# Altium integrated library Cap-El-THP_V2.IntLib: 241 symbols (part 1 of 2)
Pins are listed as number, name and electrical type; pins without a type are passive.

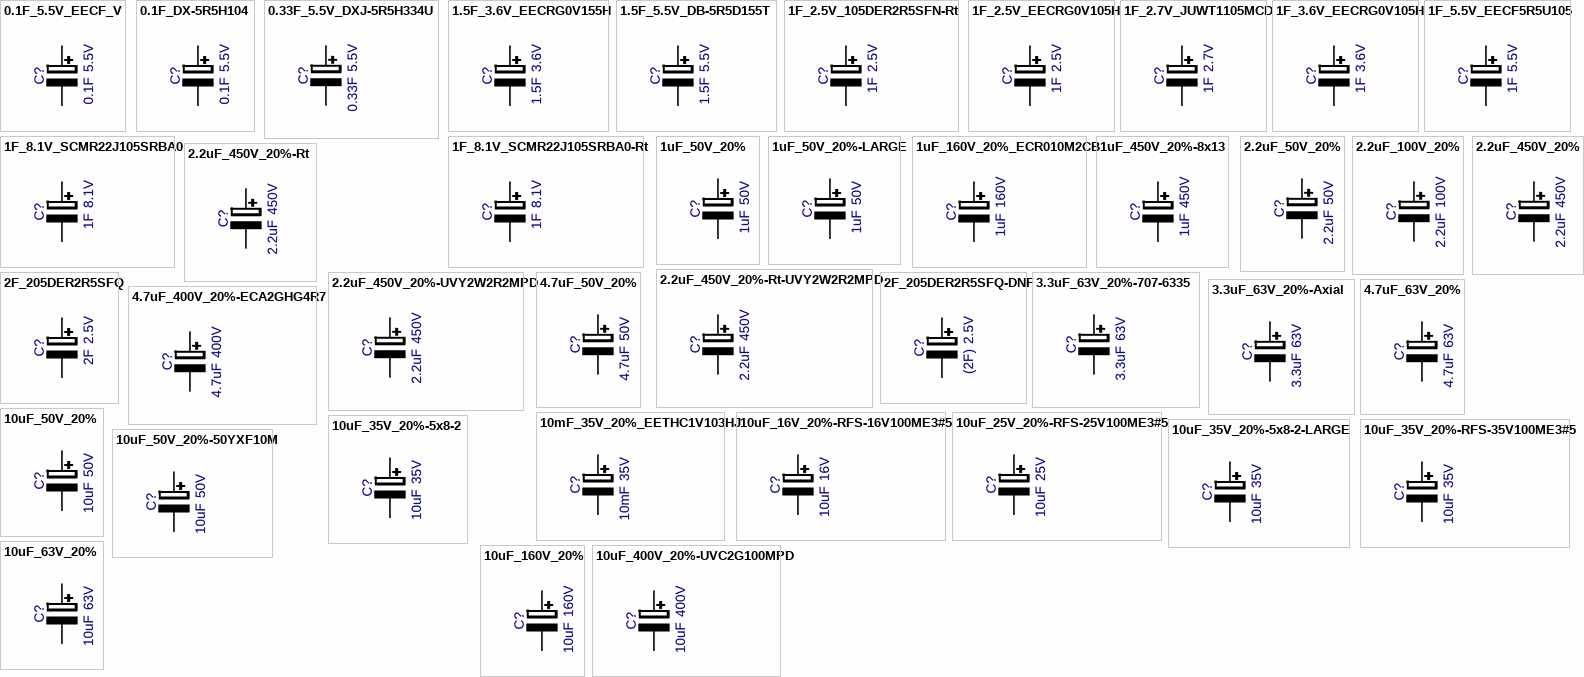
[diagram p0: symbols 0.1F_5.5V_EECF_V to 10uF_400V_20%-UVC2G100MPD]

## 0.1F_5.5V_EECF_V
designator C?, comment value 0.1F  Voltage: 5.5V  (hidden comment: CAP-EL_0.1F_5.5V_EECF)
Cap Double Layer (Super Cap); Manufacturer: Panasonic; Part Number: EECF5R5U104; Tol: 20%; Package: CAP-EECF-H; EDM-PN: *; Text2: *; Text1: *
footprint CAP-EECF-H (CAP-EECF-H 13.5x7.5mm)
pins: 1, 2

## 0.1F_DX-5R5H104
designator C?, comment value 0.1F  Voltage: 5.5V  (hidden comment: DX-5R5H104)
Cap Double Layer (Super Cap); Manufacturer: Elna; Tol: 20%; Part Number: DX-5R5H104; Package: CAP-DX-H; EDM-PN: *; Text2: *; Text1: *
footprint CAP-DX-H (CAP-DX-H 12.4x11.5mm)
pins: 1, 2

## 0.33F_5.5V_DXJ-5R5H334U
designator C?, comment value 0.33F  Voltage: 5.5V  (hidden comment: DXJ-5R5H334U)
Cap Double Layer (Super Cap); Manufacturer: Elna; Tol: 20%; Part Number: DXJ-5R5H334U; Package: CAP-DX-H; EDM-PN: *; Text2: *; Text1: *
footprint CAP-DX-H (CAP-DX-H 12.4x11.5mm)
pins: 1, 2

## 1.5F_3.6V_EECRG0V155H
designator C?, comment value 1.5F  Voltage: 3.6V  (hidden comment: EECRG0V155H)
Cap Double Layer (Gold Cap); Manufacturer: Panasonic; Tol: 1.2-2.7F; Part Number: EECRG0V155H; Package: CAP-EECRG-H-19.0mm; EDM-PN: *; Text2: *; Text1: *
footprint CAP-EECRG-H-19.0mm (CAP-EECRG-H 19.0x19.0mm)
pins: 1, 2

## 1.5F_5.5V_DB-5R5D155T
designator C?, comment value 1.5F  Voltage: 5.5V  (hidden comment: DB-5R5D155T)
Cap Double Layer Supercapacitor; Manufacturer: Elna; Tol: 20%; Part Number: DB-5R5D155T; Package: CAP-EECF-H-21.5MM; EDM-PN: *; Text2: *; Text1: *
footprint CAP-21.5mm-8MM (CAP 21.5x21.5mm)
pins: 1, 2

## 1F_2.5V_105DER2R5SFN-Rt
designator C?, comment value 1F  Voltage: 2.5V  (hidden comment: CAP-EL_1F_2.5V_105DER2R5SFN)
Cap (EDLC) Supercap; Manufacturer: Illinois Capacitor; Part Number: EECRG0V105H; Tol: +50-20%; Package: EL-RAD-8X13.5-Black-RT; EDM-PN: *; Text2: *; Text1: *
footprint EL-RAD-8X13.5-Black-RT (Capacitor, Electrolytic, THP, Radial, Dia 8.00mm, Pitch 3.50mm)
pins: 1, 2

## 1F_2.5V_EECRG0V105H
designator C?, comment value 1F  Voltage: 2.5V  (hidden comment: EECRG0V105H)
Cap (EDLC) Supercap; Manufacturer: Illinois Capacitor; Tol: +50-20%; Part Number: EECRG0V105H; Package: EL-RAD-8X13.5-Black; EDM-PN: *; Text2: *; Text1: *
footprint EL-RAD-8X13.5-Black (Capacitor, Electrolytic, THP, Radial, Dia 8.00mm, Pitch 3.50mm)
pins: 1, 2

## 1F_2.7V_JUWT1105MCD
designator C?, comment value 1F  Voltage: 2.7V  (hidden comment: JUWT1105MCD)
Cap (EDLC) Supercap; Manufacturer: Nichicon; Tol: 20%; Part Number: JUWT1105MCD; Package: EL-RAD-6.3x11; EDM-PN: *; Text2: *; Text1: *
footprint EL-RAD-6.3X11 (Capacitor, Electrolytic, THP, Radial, Dia 6.3mm, Pitch 2.5mm)
pins: 1, 2

## 1F_3.6V_EECRG0V105H
designator C?, comment value 1F  Voltage: 3.6V  (hidden comment: EECRG0V105H)
Cap Double Layer (Gold Cap); Manufacturer: Panasonic; Tol: 0.8-1.8F; Part Number: EECRG0V105H; Package: CAP-EECRG-H-19.0mm; EDM-PN: *; Text2: *; Text1: *
footprint CAP-EECRG-H-19.0mm (CAP-EECRG-H 19.0x19.0mm)
pins: 1, 2

## 1F_5.5V_EECF5R5U105
designator C?, comment value 1F  Voltage: 5.5V  (hidden comment: EECF5R5U105)
Cap Double Layer (Gold Cap); Manufacturer: Panasonic; Tol: 20%; Part Number: EECF5R5U105; Package: CAP-EECF-H-21.5MM; EDM-PN: *; Text2: *; Text1: *
footprint CAP-EECF-H-21.5mm (CAP-EECF-H 21.5x21.5mm)
pins: 1, 2

## 1F_8.1V_SCMR22J105SRBA0
designator C?, comment value 1F  Voltage: 8.1V  (hidden comment: SCMR22J105SRBA0)
Cap Supercapacitor Radial; Manufacturer: AVX; Tol: -10+30%; Part Number: SCMR22J105SRBA0; Package: SMC-8x24mm 22mm; EDM-PN: *; Text2: *; Text1: *
footprint SMC-8x24mm 22mm (Capacitor SMC-8x24mm 22mm)
pins: 1, 2

## 1F_8.1V_SCMR22J105SRBA0-Rt
designator C?, comment value 1F  Voltage: 8.1V  (hidden comment: SCMR22J105SRBA0)
Cap Supercapacitor Radial; Manufacturer: AVX; Tol: -10+30%; Part Number: SCMR22J105SRBA0; Package: SMC-8x24mm 22mm-RT; EDM-PN: *; Text2: *; Text1: *
footprint SMC-8x24mm 22mm-RT (Capacitor SMC-8x24mm 22mm)
pins: 1, 2

## 1uF_50V_20%
designator C?, comment value 1uF  Voltage: 50V  (hidden comment: CAP-EL_1uF_50V_20%)
Cap Electrolytic THP Radial; Manufacturer: Various; Tol: 20%; Part Number: CAP-EL_1uF_50V_20%; Package: EL-RAD-5x11; EDM-PN: *; Text2: *; Text1: *
footprint EL-RAD-5X11 (Capacitor, Electrolytic, THP, Radial, Dia 5.00mm, Pitch 2.0mm)
pins: 1, 2

## 1uF_50V_20%-LARGE
designator C?, comment value 1uF  Voltage: 50V  (hidden comment: CAP-EL_1uF_50V_20%)
Cap Electrolytic THP Radial; Manufacturer: Various; Tol: 20%; Part Number: CAP-EL_1uF_50V_20%; Package: EL-RAD-5X11-LARGE; EDM-PN: *; Text2: *; Text1: *
footprint EL-RAD-5X11-LARGE (Capacitor, Electrolytic, THP, Radial, Dia 5.00mm, Pitch 2.0mm)
pins: 1, 2

## 1uF_160V_20%_ECR010M2CB
designator C?, comment value 1uF  Voltage: 160V  (hidden comment: ECR010M2CB)
Cap Electrolytic THP Radial; Manufacturer: Hitano; Tol: 20%; Part Number: ECR010M2CB; Package: EL-RAD-5x11; EDM-PN: *; Text2: *; Text1: *
footprint EL-RAD-5X11 (Capacitor, Electrolytic, THP, Radial, Dia 5.00mm, Pitch 2.0mm)
pins: 1, 2

## 1uF_450V_20%-8x13
designator C?, comment value 1uF  Voltage: 450V  (hidden comment: CAP-EL_1uF_450V_20%)
Cap Electrolytic THP Radial (8x13); Manufacturer: Various; Tol: 20%; Part Number: CAP-EL_1uF_450V_20%; Package: EL-RAD-8x113; EDM-PN: *; Text2: *; Text1: *
footprint EL-RAD-8X13 (Capacitor, Electrolytic, THP, Radial, Dia 8.00mm, Pitch 3.50mm)
pins: 1, 2

## 2.2uF_50V_20%
designator C?, comment value 2.2uF  Voltage: 50V  (hidden comment: CAP-EL_2.2uF_50V_20%)
Cap Electrolytic THP Radial; Manufacturer: Various; Tol: 20%; Part Number: CAP-EL_2.2uF_50V_20%; Package: EL-RAD-5x11; EDM-PN: *; Text2: *; Text1: *
footprint EL-RAD-5X11 (Capacitor, Electrolytic, THP, Radial, Dia 5.00mm, Pitch 2.0mm)
pins: 1, 2

## 2.2uF_100V_20%
designator C?, comment value 2.2uF  Voltage: 100V  (hidden comment: CAP-EL_2.2uF_100V_20%)
Cap Electrolytic THP Radial; Manufacturer: Various; Tol: 20%; Part Number: CAP-EL_2.2uF_100V_20%; Package: EL-RAD-5x11; EDM-PN: *; Text2: *; Text1: *
footprint EL-RAD-5X11 (Capacitor, Electrolytic, THP, Radial, Dia 5.00mm, Pitch 2.0mm)
pins: 1, 2

## 2.2uF_450V_20%
designator C?, comment value 2.2uF  Voltage: 450V  (hidden comment: CAP-EL_2.2uF_450V_20%)
Cap Electrolytic THP Radial; Manufacturer: Various; Tol: 20%; Part Number: CAP-EL_2.2uF_450V_20%; Package: EL-RAD-10x13; EDM-PN: *; Text2: *; Text1: *
footprint EL-RAD-10X13 (Capacitor, Electrolytic, THP, Radial, Dia 10.00mm, Pitch 5.00mm)
pins: 1, 2

## 2.2uF_450V_20%-Rt
designator C?, comment value 2.2uF  Voltage: 450V  (hidden comment: CAP-EL_2.2uF_450V_20%-RT)
Cap Electrolytic THP Radial; Manufacturer: Various; Tol: 20%; Part Number: CAP-EL_2.2uF_450V_20%; Package: EL-RAD-10x13-RT; EDM-PN: *; Text2: *; Text1: *
footprint EL-RAD-10X13-RT (Capacitor, Electrolytic, THP, Radial, Dia 10.00mm, Pitch 5.00mm)
pins: 1, 2

## 2.2uF_450V_20%-Rt-UVY2W2R2MPD
designator C?, comment value 2.2uF  Voltage: 450V  (hidden comment: UVY2W2R2MPD)
Cap Electrolytic THP Radial - Wide Temp Range; Manufacturer: Nichicon; Tol: 20%; Part Number: UVY2W2R2MPD; Package: EL-RAD-8x11.5-RT; EDM-PN: *; Text2: *; Text1: *
footprint EL-RAD-8X11.5-RT (Capacitor, Electrolytic, THP, Radial, Dia 8.00mm, Pitch 3.50mm)
pins: 1, 2

## 2.2uF_450V_20%-UVY2W2R2MPD
designator C?, comment value 2.2uF  Voltage: 450V  (hidden comment: UVY2W2R2MPD)
Cap Electrolytic THP Radial - Wide Temp Range; Manufacturer: Nichicon; Tol: 20%; Part Number: UVY2W2R2MPD; Package: EL-RAD-8x11.5; EDM-PN: *; Text2: *; Text1: *
footprint EL-RAD-8X11.5 (Capacitor, Electrolytic, THP, Radial, Dia 8.00mm, Pitch 3.50mm)
pins: 1, 2

## 2F_205DER2R5SFQ
designator C?, comment value 2F  Voltage: 2.5V  (hidden comment: 205DER2R5SFQ)
Cap Supercapacitor 2.5V Radial; Manufacturer: Illinois Capacitor; Tol: 20%; Part Number: 205DER2R5SFQ; Package: EL-RAD-8X17; EDM-PN: *; Text2: *; Text1: *
footprint EL-RAD-8X17 (Capacitor, Electrolytic, THP, Radial, Dia 8.00mm, Pitch 3.50mm)
pins: 1, 2

## 2F_205DER2R5SFQ-DNF
designator C?, comment value (2F)  Voltage: 2.5V  (hidden comment: 205DER2R5SFQ)
Cap Supercapacitor 2.5V Radial - Do not Fit; Manufacturer: Illinois Capacitor; Part Number: DNF - 205DER2R5SFQ; Tol: 20%; Package: EL-RAD-8X17; EDM-PN: *; Text2: *; Text1: *
footprint EL-RAD-8X17 (Capacitor, Electrolytic, THP, Radial, Dia 8.00mm, Pitch 3.50mm)
pins: 1, 2

## 3.3uF_63V_20%-707-6335
designator C?, comment value 3.3uF  Voltage: 63V  (hidden comment: 707-6335)
Cap Electrolytic THP Axial; Manufacturer: RS Pro; Tol: 20%; Part Number: 707-6335; Package: EL-AX-13x6; EDM-PN: *; Text2: *; Text1: *
footprint EL-AX-13-06 (Cap El Axial 13.0x6.0mm)
pins: 1, 2

## 3.3uF_63V_20%-Axial
designator C?, comment value 3.3uF  Voltage: 63V  (hidden comment: CAP-EL_3.3uF_63V_20% Axial)
Cap Electrolytic THP Axial; Manufacturer: Various; Tol: 20%; Part Number: CAP-EL_3.3uF_63V_20% Axial; Package: EL-AX-13x6; EDM-PN: *; Text2: *; Text1: *
footprint EL-AX-13-06 (Cap El Axial 13.0x6.0mm)
pins: 1, 2

## 4.7uF_50V_20%
designator C?, comment value 4.7uF  Voltage: 50V  (hidden comment: CAP-EL_4.7uF_50V_20%)
Cap Electrolytic THP Radial; Manufacturer: Various; Tol: 20%; Part Number: CAP-EL_4.7uF_50V_20%; Package: EL-RAD-5x11; EDM-PN: *; Text2: *; Text1: *
footprint EL-RAD-5X11 (Capacitor, Electrolytic, THP, Radial, Dia 5.00mm, Pitch 2.0mm)
pins: 1, 2

## 4.7uF_63V_20%
designator C?, comment value 4.7uF  Voltage: 63V  (hidden comment: CAP-EL_4.7uF_63V_20%)
Cap Electrolytic THP Radial; Manufacturer: Various; Tol: 20%; Part Number: CAP-EL_4.7uF_63V_20%; Package: EL-RAD-5x12.5; EDM-PN: *; Text2: *; Text1: *
footprint EL-RAD-5X12.5 (Capacitor, Electrolytic, THP, Radial, Dia 5.00mm, Pitch 2.0mm)
pins: 1, 2

## 4.7uF_400V_20%-ECA2GHG4R7
designator C?, comment value 4.7uF  Voltage: 400V  (hidden comment: ECA2GHG4R7)
Cap Electrolytic THP Radial; Manufacturer: Panasonic; Tol: 20%; Part Number: ECA2GHG4R7; Package: EL-RAD-10x16; EDM-PN: *; Text2: *; Text1: *
footprint EL-RAD-10x16 (Capacitor, Electrolytic, THP, Radial, Dia 10.00mm, Pitch 5.00mm)
pins: 1, 2

## 10mF_35V_20%_EETHC1V103HJ
designator C?, comment value 10mF  Voltage: 35V  (hidden comment: EETHC1V103HJ)
Cap Electrolytic THP Radial; Manufacturer: Panasonic; Tol: 20%; Part Number: EETHC1V103HJ; Package: EL-RAD-22x45; EDM-PN: *; Text2: *; Text1: *
footprint EL-RAD-23x45 (Capacitor, Electrolytic, THP, Radial, Dia 23.20mm, Pitch 10.00mm)
pins: 1, 2

## 10uF_16V_20%-RFS-16V100ME3#5
designator C?, comment value 10uF  Voltage: 16V  (hidden comment: RFS-16V100ME3#5)
Cap Electrolytic THP Radial (Audio); Manufacturer: Elna America; Tol: 20%; Part Number: RFS-16V100ME3#5; Package: EL-RAD-5x11; EDM-PN: *; Text2: *; Text1: *
footprint EL-RAD-5X11 (Capacitor, Electrolytic, THP, Radial, Dia 5.00mm, Pitch 2.0mm)
pins: 1, 2

## 10uF_25V_20%-RFS-25V100ME3#5
designator C?, comment value 10uF  Voltage: 25V  (hidden comment: RFS-25V100ME3#5)
Cap Electrolytic THP Radial (Audio); Manufacturer: Elna America; Tol: 20%; Part Number: RFS-25V100ME3#5; Package: EL-RAD-5x11; EDM-PN: *; Text2: *; Text1: *
footprint EL-RAD-5X11 (Capacitor, Electrolytic, THP, Radial, Dia 5.00mm, Pitch 2.0mm)
pins: 1, 2

## 10uF_35V_20%-5x8-2
designator C?, comment value 10uF  Voltage: 35V  (hidden comment: CAP-EL_10uF_35V_20%)
Cap Electrolytic THP Radial (5x8mm 2mm); Manufacturer: Various; Tol: 20%; Part Number: CAP-EL_10uF_35V_20%; Package: EL-RAD-5x8-2mm; EDM-PN: *; Text2: *; Text1: *
footprint EL-RAD-5X8-2mm (Capacitor, Electrolytic, THP, Radial, Dia 5.00mm, Pitch 2.0mm)
pins: 1, 2

## 10uF_35V_20%-5x8-2-LARGE
designator C?, comment value 10uF  Voltage: 35V  (hidden comment: CAP-EL_10uF_35V_20%)
Cap Electrolytic THP Radial (5x8mm 2mm); Manufacturer: Various; Tol: 20%; Part Number: CAP-EL_10uF_35V_20%; Package: EL-RAD-5X8-2mm-LARGE; EDM-PN: *; Text2: *; Text1: *
footprint EL-RAD-5X8-2mm-LARGE (Capacitor, Electrolytic, THP, Radial, Dia 5.00mm, Pitch 2.0mm)
pins: 1, 2

## 10uF_35V_20%-RFS-35V100ME3#5
designator C?, comment value 10uF  Voltage: 35V  (hidden comment: RFS-35V100ME3#5)
Cap Electrolytic THP Radial (Audio); Manufacturer: Elna America; EDM-PN: CAP1303; Tol: 20%; Part Number: RFS-35V100ME3#5; Package: EL-RAD-5x11; Text2: *; Text1: *
footprint EL-RAD-5X11 (Capacitor, Electrolytic, THP, Radial, Dia 5.00mm, Pitch 2.0mm)
pins: 1, 2

## 10uF_50V_20%
designator C?, comment value 10uF  Voltage: 50V  (hidden comment: CAP-EL_10uF_50V_20%)
Cap Electrolytic THP Radial; Manufacturer: Various; EDM-PN: CAP39; Tol: 20%; Part Number: CAP-EL_10uF_50V_20%; Package: EL-RAD-5x11; Text2: *; Text1: *
footprint EL-RAD-5X11 (Capacitor, Electrolytic, THP, Radial, Dia 5.00mm, Pitch 2.0mm)
pins: 1, 2

## 10uF_50V_20%-50YXF10M
designator C?, comment value 10uF  Voltage: 50V  (hidden comment: 50YXF10M)
Cap Electrolytic THP Radial Low Imp; Manufacturer: Rubycon; Tol: 20%; Reutech PN: 5910-EL-0070; Part Number: 50YXF10M; Package: EL-RAD-5x11; EDM-PN: *; Text2: *; Text1: *
footprint EL-RAD-5X11 (Capacitor, Electrolytic, THP, Radial, Dia 5.00mm, Pitch 2.0mm)
pins: 1, 2

## 10uF_63V_20%
designator C?, comment value 10uF  Voltage: 63V  (hidden comment: CAP-EL_10uF_63V_20%)
Cap Electrolytic THP Radial; Manufacturer: Various; Tol: 20%; Part Number: CAP-EL_10uF_63V_20%; Package: EL-RAD-5x11; EDM-PN: *; Text2: *; Text1: *
footprint EL-RAD-5X11 (Capacitor, Electrolytic, THP, Radial, Dia 5.00mm, Pitch 2.0mm)
pins: 1, 2

## 10uF_160V_20%
designator C?, comment value 10uF  Voltage: 160V  (hidden comment: CAP-EL_10uF_160V_20%)
Cap Electrolytic THP Radial (10x12.5mm); Manufacturer: Various; Tol: 20%; Part Number: CAP-EL_10uF_160V_20%; Package: EL-RAD-10X13; EDM-PN: *; Text2: *; Text1: *
footprint EL-RAD-10X13 (Capacitor, Electrolytic, THP, Radial, Dia 10.00mm, Pitch 5.00mm)
pins: 1, 2

## 10uF_400V_20%-UVC2G100MPD
designator C?, comment value 10uF  Voltage: 400V  (hidden comment: UVC2G100MPD)
Cap Electrolytic THP Radial (10x12.5mm) VC Series; Manufacturer: Nichicon; Tol: 20%; Part Number: UVC2G100MPD; Package: EL-RAD-10X13; EDM-PN: *; Text2: *; Text1: *
footprint EL-RAD-10X13 (Capacitor, Electrolytic, THP, Radial, Dia 10.00mm, Pitch 5.00mm)
pins: 1, 2

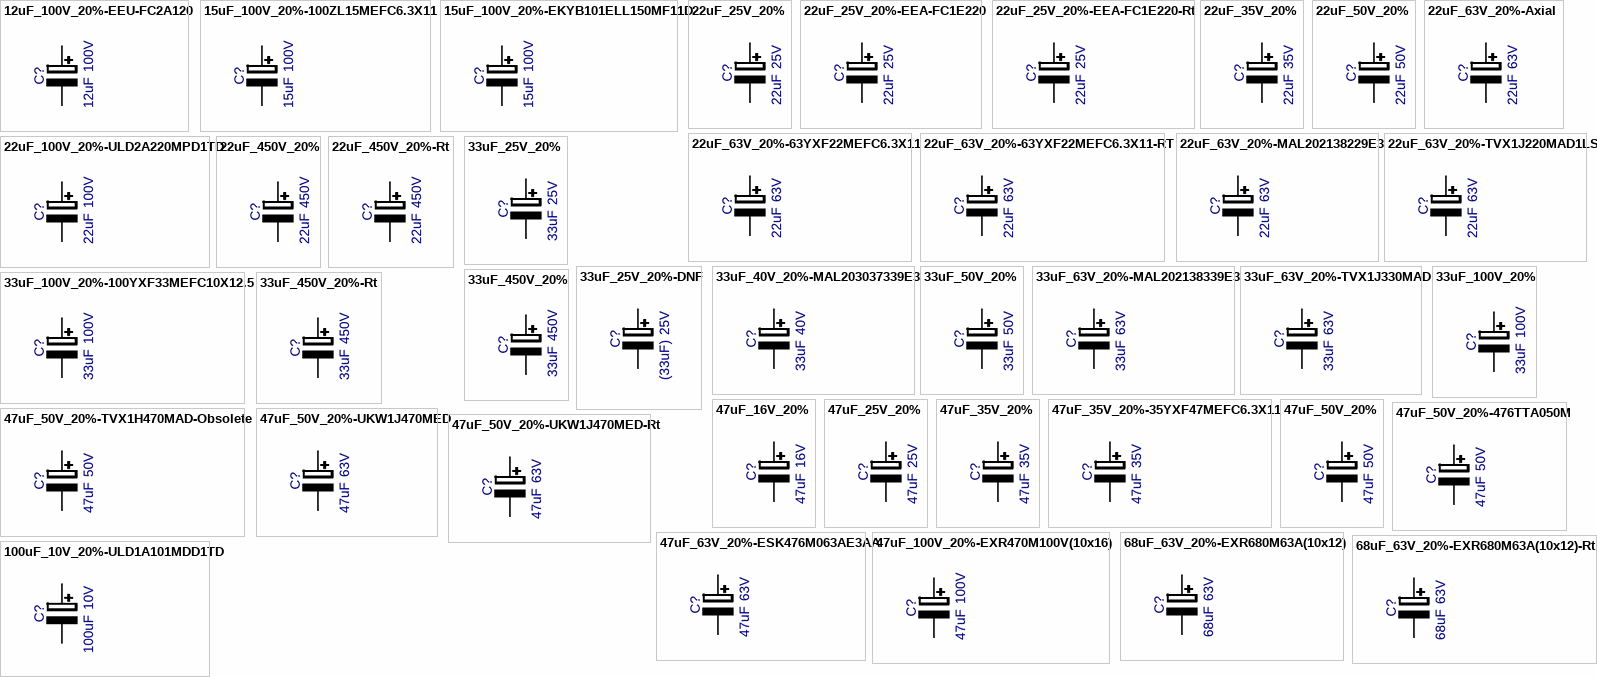
[diagram p1: symbols 12uF_100V_20%-EEU-FC2A120 to 100uF_10V_20%-ULD1A101MDD1TD]

## 12uF_100V_20%-EEU-FC2A120
designator C?, comment value 12uF  Voltage: 100V  (hidden comment: EEU-FC2A120)
Cap Electrolytic THP Radial (6.3x12.5mm); Manufacturer: Panasonic; Tol: 20%; Part Number: EEU-FC2A120; Package: EL-RAD-6.3x12.5; EDM-PN: *; Text2: *; Text1: *
footprint EL-RAD-6.3X12.5 (Capacitor, Electrolytic, THP, Radial, Dia 6.3mm, Pitch 2.5mm)
pins: 1, 2

## 15uF_100V_20%-100ZL15MEFC6.3X11
designator C?, comment value 15uF  Voltage: 100V  (hidden comment: 100ZL15MEFC6.3X11)
Cap Electrolytic THP Radial Low Imp (6.3x12.5mm); Manufacturer: Rubycon; Tol: 20%; Part Number: 100ZL15MEFC6.3X11; Package: EL-RAD-6.3x12.5; EDM-PN: *; Text2: *; Text1: *
footprint EL-RAD-6.3X12.5 (Capacitor, Electrolytic, THP, Radial, Dia 6.3mm, Pitch 2.5mm)
pins: 1, 2

## 15uF_100V_20%-EKYB101ELL150MF11D
designator C?, comment value 15uF  Voltage: 100V  (hidden comment: EKYB101ELL150MF11D)
Cap Electrolytic THP Radial Low Imp (6.3x12.5mm); Manufacturer: United Chemi-Con; Tol: 20%; Part Number: EKYB101ELL150MF11D; Package: EL-RAD-6.3x12.5; EDM-PN: *; Text2: *; Text1: *
footprint EL-RAD-6.3X12.5 (Capacitor, Electrolytic, THP, Radial, Dia 6.3mm, Pitch 2.5mm)
pins: 1, 2

## 22uF_25V_20%
designator C?, comment value 22uF  Voltage: 25V  (hidden comment: CAP-EL_22uF_25V_20%)
Cap Electrolytic THP Radial; Manufacturer: Various; Tol: 20%; Part Number: CAP-EL_22uF_25V_20%; Package: EL-RAD-5x7; EDM-PN: *; Text2: *; Text1: *
footprint EL-RAD-5X7 (Capacitor, Electrolytic, THP, Radial, Dia 5.00mm, Pitch 2.0mm)
pins: 1, 2

## 22uF_25V_20%-EEA-FC1E220
designator C?, comment value 22uF  Voltage: 25V  (hidden comment: EEA-FC1E220)
Cap Electrolytic THP Radial Low ESR; Manufacturer: Panasonic; EDM-PN: CAP1328; Tol: 20%; Part Number: EEA-FC1E220; Package: EL-RAD-5x7; Text2: *; Text1: *
footprint EL-RAD-5X7 (Capacitor, Electrolytic, THP, Radial, Dia 5.00mm, Pitch 2.0mm)
pins: 1, 2

## 22uF_25V_20%-EEA-FC1E220-Rt
designator C?, comment value 22uF  Voltage: 25V  (hidden comment: EEA-FC1E220)
Cap Electrolytic THP Radial Low ESR; Manufacturer: Panasonic; EDM-PN: CAP1328; Tol: 20%; Part Number: EEA-FC1E220; Package: EL-RAD-5x7-RT; Text2: *; Text1: *
footprint EL-RAD-5X7-RT (Capacitor, Electrolytic, THP, Radial, Dia 5.00mm, Pitch 2.0mm)
pins: 1, 2

## 22uF_35V_20%
designator C?, comment value 22uF  Voltage: 35V  (hidden comment: CAP-EL_22uF_35V_20%)
Cap Electrolytic THP Radial; Manufacturer: Various; EDM-PN: CAP60; Tol: 20%; Part Number: CAP-EL_22uF_35V_20%; Package: EL-RAD-5x11; Text2: *; Text1: *
footprint EL-RAD-5X11 (Capacitor, Electrolytic, THP, Radial, Dia 5.00mm, Pitch 2.0mm)
pins: 1, 2

## 22uF_50V_20%
designator C?, comment value 22uF  Voltage: 50V  (hidden comment: CAP-EL_22uF_50V_20%)
Cap Electrolytic THP Radial; Manufacturer: Various; Tol: 20%; Part Number: CAP-EL_22uF_50V_20%; Package: EL-RAD-5x11; EDM-PN: *; Text2: *; Text1: *
footprint EL-RAD-5X11 (Capacitor, Electrolytic, THP, Radial, Dia 5.00mm, Pitch 2.0mm)
pins: 1, 2

## 22uF_63V_20%-63YXF22MEFC6.3X11
designator C?, comment value 22uF  Voltage: 63V  (hidden comment: 63YXF22MEFC6.3X11)
Cap Electrolytic THP Radial - Low Imp; Manufacturer: Rubycon; Tol: 20%; Reutech PN: 5910-EL-0115; Part Number: 63YXF22MEFC6.3X11; Package: EL-RAD-6.3x11; EDM-PN: *; Text2: *; Text1: *
footprint EL-RAD-6.3X11 (Capacitor, Electrolytic, THP, Radial, Dia 6.3mm, Pitch 2.5mm)
pins: 1, 2

## 22uF_63V_20%-63YXF22MEFC6.3X11-RT
designator C?, comment value 22uF  Voltage: 63V  (hidden comment: 63YXF22MEFC6.3X11)
Cap Electrolytic THP Radial - Low Imp; Manufacturer: Rubycon; Tol: 20%; Reutech PN: 5910-EL-0115; Part Number: 63YXF22MEFC6.3X11; Package: EL-RAD-6.3x11-Rt; EDM-PN: *; Text2: *; Text1: *
footprint EL-RAD-6.3X11-RT (Capacitor, Electrolytic, THP, Radial, Dia 6.3x11.0mm, Pitch 2.5mm)
pins: 1, 2

## 22uF_63V_20%-Axial
designator C?, comment value 22uF  Voltage: 63V  (hidden comment: 22uF_63V_20%)
Cap Electrolytic THP Axial (10x6mm); Manufacturer: Various; Part Number: Cap El 22uF_63V_20% Axial; Tol: 20%; Package: EL-AX-10x6; EDM-PN: *; Text2: *; Text1: *
footprint EL-AX-10-06 (Cap El Axial 10.0x6.0mm)
pins: 1, 2

## 22uF_63V_20%-MAL202138229E3
designator C?, comment value 22uF  Voltage: 63V  (hidden comment: MAL202138229E3)
Cap Electrolytic THP Axial (10x6mm); Manufacturer: Vishay; Tol: 20%; Part Number: MAL202138229E3; Package: EL-AX-10x6; EDM-PN: *; Text2: *; Text1: *
footprint EL-AX-10-06 (Cap El Axial 10.0x6.0mm)
pins: 1, 2

## 22uF_63V_20%-TVX1J220MAD1LS
designator C?, comment value 22uF  Voltage: 63V  (hidden comment: TVX1J220MAD1LS)
Cap Electrolytic THP Axial (12x6.3mm); Manufacturer: Nichicon; Tol: 20%; Part Number: TVX1J220MAD1LS; Package: EL-AX-12x06.3; EDM-PN: *; Text2: *; Text1: *
footprint EL-AX-12-06.3 (Cap El Axial 12.0x6.0mm)
pins: 1, 2

## 22uF_100V_20%-ULD2A220MPD1TD
designator C?, comment value 22uF  Voltage: 100V  (hidden comment: ULD2A220MPD1TD)
Cap Electrolytic THP Radial (8.0x13.5mm); Manufacturer: Nichicon; Tol: 20%; Part Number: ULD2A220MPD1TD; Package: EL-RAD-8X13.5; EDM-PN: *; Text2: *; Text1: *
footprint EL-RAD-8X13.5 (Capacitor, Electrolytic, THP, Radial, Dia 8.00mm, Pitch 3.50mm)
pins: 1, 2

## 22uF_450V_20%
designator C?, comment value 22uF  Voltage: 450V  (hidden comment: CAP-EL_22uF_450V_20%-PK)
Cap Electrolytic THP Radial (16x25); Manufacturer: Various; Tol: 20%; Part Number: 22uF_450V_20%; Package: EL-RAD-16x25; EDM-PN: *; Text2: *; Text1: *
footprint EL-RAD-16x25 (Capacitor, Electrolytic, THP, Radial, Dia 16.0mm, Pitch 7.50mm)
pins: 1, 2

## 22uF_450V_20%-Rt
designator C?, comment value 22uF  Voltage: 450V  (hidden comment: CAP-EL_22uF_450V_20%-PK-Rt)
Cap Electrolytic THP Radial (16x25); Manufacturer: Various; Part Number: Cap El. 22uF_450V_20%; Tol: 20%; Package: EL-RAD-16x25-RT; EDM-PN: *; Text2: *; Text1: *
footprint EL-RAD-16x25-RT (Capacitor, Electrolytic, THP, Radial, Dia 16.0mm, Pitch 5.00mm)
pins: 1, 2

## 33uF_25V_20%
designator C?, comment value 33uF  Voltage: 25V  (hidden comment: CAP-EL_33uF_25V_20%)
Cap Electrolytic THP Radial; Manufacturer: Various; Tol: 20%; Part Number: CAP-EL_33uF_25V_20%; Package: EL-RAD-5x11; EDM-PN: *; Text2: *; Text1: *
footprint EL-RAD-5X11 (Capacitor, Electrolytic, THP, Radial, Dia 5.00mm, Pitch 2.0mm)
pins: 1, 2

## 33uF_25V_20%-DNF
designator C?, comment value (33uF)  Voltage: 25V  (hidden comment: CAP-EL_33uF_25V_20%)
Cap Electrolytic THP Radial - Do not Fit; Manufacturer: Various; Part Number: DNF - CAP-EL_33uF_25V_20%; Tol: 20%; Package: EL-RAD-5x11; EDM-PN: *; Text2: *; Text1: *
footprint EL-RAD-5X11 (Capacitor, Electrolytic, THP, Radial, Dia 5.00mm, Pitch 2.0mm)
pins: 1, 2

## 33uF_40V_20%-MAL203037339E3
designator C?, comment value 33uF  Voltage: 40V  (hidden comment: MAL203037339E3)
Cap Electrolytic THP Axial (10x6mm); Manufacturer: Vishay; Tol: 20%; Part Number: MAL203037339E3; Package: EL-AX-10x6; EDM-PN: *; Text2: *; Text1: *
footprint EL-AX-10-06 (Cap El Axial 10.0x6.0mm)
pins: 1, 2

## 33uF_50V_20%
designator C?, comment value 33uF  Voltage: 50V  (hidden comment: CAP-EL_33uF_50V_20%)
Cap Electrolytic THP Radial; Manufacturer: Various; Tol: 20%; Part Number: CAP-EL_33uF_50V_20%; Package: EL-RAD-5x11; EDM-PN: *; Text2: *; Text1: *
footprint EL-RAD-5X11 (Capacitor, Electrolytic, THP, Radial, Dia 5.00mm, Pitch 2.0mm)
pins: 1, 2

## 33uF_63V_20%-MAL202138339E3
designator C?, comment value 33uF  Voltage: 63V  (hidden comment: MAL202138339E3)
Cap Electrolytic THP Axial (10x6mm); Manufacturer: Vishay; Tol: 20%; Part Number: MAL202138339E3; Package: EL-AX-10x6; EDM-PN: *; Text2: *; Text1: *
footprint EL-AX-10-06 (Cap El Axial 10.0x6.0mm)
pins: 1, 2

## 33uF_63V_20%-TVX1J330MAD
designator C?, comment value 33uF  Voltage: 63V  (hidden comment: TVX1J330MAD)
Cap Electrolytic THP Axial (17x6.3mm); Manufacturer: Nichicon; Tol: 20%; Part Number: TVX1J330MAD; Package: EL-AX-17x06.3; EDM-PN: *; Text2: *; Text1: *
footprint EL-AX-17-06.3 (Cap El Axial 17.0x6.0mm)
pins: 1, 2

## 33uF_100V_20%
designator C?, comment value 33uF  Voltage: 100V  (hidden comment: CAP-EL_33uF_100V_20%)
Cap Electrolytic THP Radial; Manufacturer: Various; Tol: 20%; Part Number: CAP-EL_33uF_100V_20%; Package: EL-RAD-8x11.5; EDM-PN: *; Text2: *; Text1: *
footprint EL-RAD-8X11.5 (Capacitor, Electrolytic, THP, Radial, Dia 8.00mm, Pitch 3.50mm)
pins: 1, 2

## 33uF_100V_20%-100YXF33MEFC10X12.5
designator C?, comment value 33uF  Voltage: 100V  (hidden comment: 100YXF33MEFC10X12.5)
Cap Electrolytic THP Radial - Low Imp; Manufacturer: Rubycon; Tol: 20%; Part Number: 100YXF33MEFC10X12.5; Package: EL-RAD-10x13; EDM-PN: *; Text2: *; Text1: *
footprint EL-RAD-10X13 (Capacitor, Electrolytic, THP, Radial, Dia 10.00mm, Pitch 5.00mm)
pins: 1, 2

## 33uF_450V_20%
designator C?, comment value 33uF  Voltage: 450V  (hidden comment: CAP-EL_33uF_450V_20%)
Cap Electrolytic THP Radial; Manufacturer: Various; Tol: 20%; Part Number: CAP-EL_33uF_450V_20%; Package: EL-RAD-18x35.5; EDM-PN: *; Text2: *; Text1: *
footprint EL-RAD-18x35.5 (Capacitor, Electrolytic, THP, Radial, Dia 18.00mm, Pitch 7.50mm)
pins: 1, 2

## 33uF_450V_20%-Rt
designator C?, comment value 33uF  Voltage: 450V  (hidden comment: CAP-EL_33uF_450V_20%-Rt)
Cap Electrolytic THP Radial; Manufacturer: Various; Tol: 20%; Part Number: CAP-EL_33uF_450V_20%; Package: EL-RAD-18x35.5-Rt; EDM-PN: *; Text2: *; Text1: *
footprint EL-RAD-18x35.5-Rt (Capacitor, Electrolytic, THP, Radial, Dia 18.00mm, Pitch 7.50mm)
pins: 1, 2

## 47uF_16V_20%
designator C?, comment value 47uF  Voltage: 16V  (hidden comment: CAP-EL_47uF_16V_20%)
Cap Electrolytic THP Radial; Manufacturer: Various; Tol: 20%; Part Number: CAP-EL_47uF_16V_20%; Package: EL-RAD-5x11; EDM-PN: *; Text2: *; Text1: *
footprint EL-RAD-5X11 (Capacitor, Electrolytic, THP, Radial, Dia 5.00mm, Pitch 2.0mm)
pins: 1, 2

## 47uF_25V_20%
designator C?, comment value 47uF  Voltage: 25V  (hidden comment: CAP-EL_47uF_25V_20%)
Cap Electrolytic THP Radial; Manufacturer: Various; Tol: 20%; Part Number: CAP-EL_47uF_25V_20%; Package: EL-RAD-5x11; EDM-PN: *; Text2: *; Text1: *
footprint EL-RAD-5X11 (Capacitor, Electrolytic, THP, Radial, Dia 5.00mm, Pitch 2.0mm)
pins: 1, 2

## 47uF_35V_20%
designator C?, comment value 47uF  Voltage: 35V  (hidden comment: CAP-EL_47uF_35V_20%)
Cap Electrolytic THP Radial; Manufacturer: Various; Tol: 20%; Part Number: CAP-EL_47uF_35V_20%; Package: EL-RAD-5x11; EDM-PN: *; Text2: *; Text1: *
footprint EL-RAD-5X11 (Capacitor, Electrolytic, THP, Radial, Dia 5.00mm, Pitch 2.0mm)
pins: 1, 2

## 47uF_35V_20%-35YXF47MEFC6.3X11
designator C?, comment value 47uF  Voltage: 35V  (hidden comment: 35YXF47MEFC6.3X11)
Cap Electrolytic THP Radial; Manufacturer: Rubycon; Tol: 20%; Reutech PN: 5910-EL-0165; Part Number: 35YXF47MEFC6.3X11; Package: EL-RAD-6.3X11; EDM-PN: *; Text2: *; Text1: *
footprint EL-RAD-6.3X11 (Capacitor, Electrolytic, THP, Radial, Dia 6.3mm, Pitch 2.5mm)
pins: 1, 2

## 47uF_50V_20%
designator C?, comment value 47uF  Voltage: 50V  (hidden comment: CAP-EL_47uF_50V_20%)
Cap Electrolytic THP Radial; Manufacturer: Various; Tol: 20%; Part Number: CAP-EL_47uF_50V_20%; Package: EL-RAD-6.3x11; EDM-PN: *; Text2: *; Text1: *
footprint EL-RAD-6.3X11 (Capacitor, Electrolytic, THP, Radial, Dia 6.3mm, Pitch 2.5mm)
pins: 1, 2

## 47uF_50V_20%-476TTA050M
designator C?, comment value 47uF  Voltage: 50V  (hidden comment: 476TTA050M)
Cap Electrolytic THP Axial 16x6.3mm; Manufacturer: Illinois; Tol: 20%; Part Number: 476TTA050M; Package: EL-AX-17x06.3; EDM-PN: *; Text2: *; Text1: *
footprint EL-AX-17-06.3 (Cap El Axial 17.0x6.0mm)
pins: 1, 2

## 47uF_50V_20%-TVX1H470MAD-Obsolete
designator C?, comment value 47uF  Voltage: 50V  (hidden comment: TVX1H470MAD)
Cap Electrolytic THP Axial 16x6.3mm (use 476TTA050M); Manufacturer: Nichicon; Tol: 20%; Part Number: TVX1H470MAD; Package: EL-AX-17x06.3; EDM-PN: *; Text2: *; Text1: *
footprint EL-AX-17-06.3 (Cap El Axial 17.0x6.0mm)
pins: 1, 2

## 47uF_50V_20%-UKW1J470MED
designator C?, comment value 47uF  Voltage: 63V  (hidden comment: UKW1J470MED)
Cap Electrolytic THP Radial; Manufacturer: Nichicon; Tol: 20%; Part Number: UKW1J470MED; Package: EL-RAD-6.3x11; EDM-PN: *; Text2: *; Text1: *
footprint EL-RAD-6.3X11 (Capacitor, Electrolytic, THP, Radial, Dia 6.3mm, Pitch 2.5mm)
pins: 1, 2

## 47uF_50V_20%-UKW1J470MED-Rt
designator C?, comment value 47uF  Voltage: 63V  (hidden comment: UKW1J470MED)
Cap Electrolytic THP Radial; Manufacturer: Nichicon; Tol: 20%; Part Number: UKW1J470MED; Package: EL-RAD-6.3X11-RT; EDM-PN: *; Text2: *; Text1: *
footprint EL-RAD-6.3X11-RT (Capacitor, Electrolytic, THP, Radial, Dia 6.3x11.0mm, Pitch 2.5mm)
pins: 1, 2

## 47uF_63V_20%-ESK476M063AE3AA
designator C?, comment value 47uF  Voltage: 63V  (hidden comment: ESK476M063AE3AA)
Cap Electrolytic THP Radial; Manufacturer: Kemet; Tol: 20%; Part Number: ESK476M063AE3AA; Package: EL-RAD-6.3X12.5; EDM-PN: *; Text2: *; Text1: *
footprint EL-RAD-6.3X12.5 (Capacitor, Electrolytic, THP, Radial, Dia 6.3mm, Pitch 2.5mm)
pins: 1, 2

## 47uF_100V_20%-EXR470M100V(10x16)
designator C?, comment value 47uF  Voltage: 100V  (hidden comment: EXR470M100V(10x16))
Cap Electrolytic THP Radial; Manufacturer: Hitano; Tol: 20%; Part Number: EXR470M100V(10x16); Package: EL-RAD-10x16; EDM-PN: *; Text2: *; Text1: *
footprint EL-RAD-10x16 (Capacitor, Electrolytic, THP, Radial, Dia 10.00mm, Pitch 5.00mm)
pins: 1, 2

## 68uF_63V_20%-EXR680M63A(10x12)
designator C?, comment value 68uF  Voltage: 63V  (hidden comment: EXR680M63A(10x12))
Cap Electrolytic THP Radial - Low Impedance; Manufacturer: Hitano; Tol: 20%; Part Number: EXR680M63A(10x12); Package: EL-RAD-10x13; EDM-PN: *; Text2: *; Text1: *
footprint EL-RAD-10x13 (Capacitor, Electrolytic, THP, Radial, Dia 10.00mm, Pitch 5.00mm)
pins: 1, 2

## 68uF_63V_20%-EXR680M63A(10x12)-Rt
designator C?, comment value 68uF  Voltage: 63V  (hidden comment: EXR680M63A(10x12))
Cap Electrolytic THP Radial - Low Impedance; Manufacturer: Hitano; Tol: 20%; Part Number: EXR680M63A(10x12); Package: EL-RAD-10x13-RT; EDM-PN: *; Text2: *; Text1: *
footprint EL-RAD-10x13-RT (Capacitor, Electrolytic, THP, Radial, Dia 10.00mm, Pitch 5.00mm)
pins: 1, 2

## 100uF_10V_20%-ULD1A101MDD1TD
designator C?, comment value 100uF  Voltage: 10V  (hidden comment: ULD1A101MDD1TD)
Cap Electrolytic THP Radial; Manufacturer: Nichicon; Tol: 20%; Part Number: ULD1A101MDD1TD; Package: EL-RAD-5x12.5; EDM-PN: *; Text2: *; Text1: *
footprint EL-RAD-5X12.5 (Capacitor, Electrolytic, THP, Radial, Dia 5.00mm, Pitch 2.0mm)
pins: 1, 2

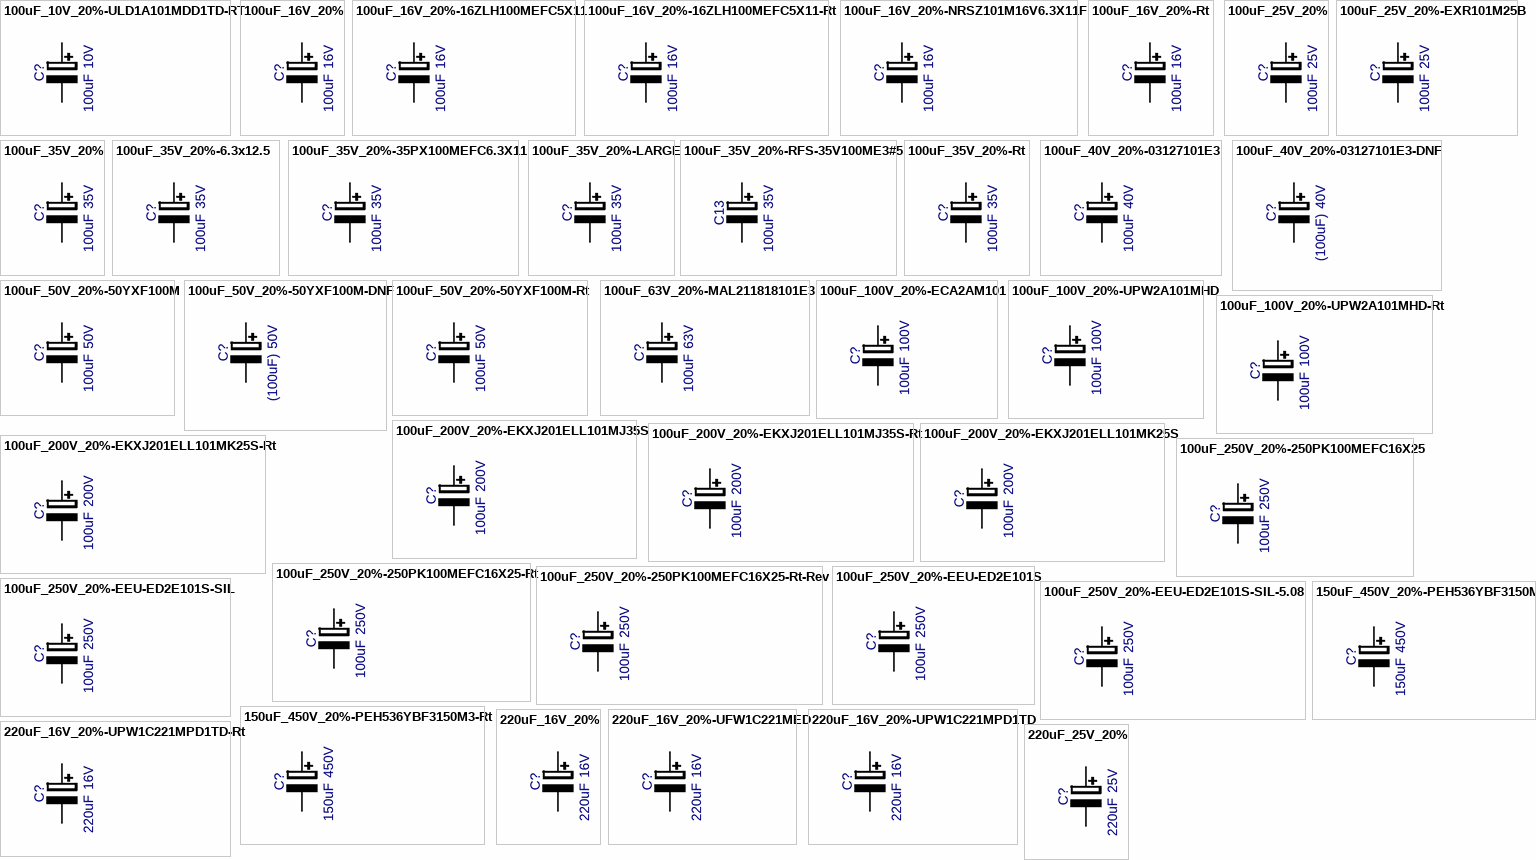
[diagram p2: symbols 100uF_10V_20%-ULD1A101MDD1TD-RT to 220uF_25V_20%]

## 100uF_10V_20%-ULD1A101MDD1TD-RT
designator C?, comment value 100uF  Voltage: 10V  (hidden comment: ULD1A101MDD1TD)
Cap Electrolytic THP Radial; Manufacturer: Nichicon; Tol: 20%; Part Number: ULD1A101MDD1TD; Package: EL-RAD-5x12.5-RT; EDM-PN: *; Text2: *; Text1: *
footprint EL-RAD-5X12.5-RT (Capacitor, Electrolytic, THP, Radial, Dia 5.00mm, Pitch 2.0mm)
pins: 1, 2

## 100uF_16V_20%
designator C?, comment value 100uF  Voltage: 16V  (hidden comment: CAP-EL_100uF_16V_20%)
Cap Electrolytic THP Radial; Manufacturer: Various; Tol: 20%; Part Number: CAP-EL_100uF_16V_20%; Package: EL-RAD-5x11; EDM-PN: *; Text2: *; Text1: *
footprint EL-RAD-5X11 (Capacitor, Electrolytic, THP, Radial, Dia 5.00mm, Pitch 2.0mm)
pins: 1, 2

## 100uF_16V_20%-16ZLH100MEFC5X11
designator C?, comment value 100uF  Voltage: 16V  (hidden comment: 16ZLH100MEFC5X11)
Cap Electrolytic THP Radial; Manufacturer: Rubycon; EDM-PN: CAP131; Tol: 20%; Part Number: 16ZLH100MEFC5X11; Package: EL-RAD-5x11; Text2: *; Text1: *
footprint EL-RAD-5X11 (Capacitor, Electrolytic, THP, Radial, Dia 5.00mm, Pitch 2.0mm)
pins: 1, 2

## 100uF_16V_20%-16ZLH100MEFC5X11-Rt
designator C?, comment value 100uF  Voltage: 16V  (hidden comment: 16ZLH100MEFC5X11)
Cap Electrolytic THP Radial; Manufacturer: Rubycon; EDM-PN: CAP131; Tol: 20%; Part Number: 16ZLH100MEFC5X11; Package: EL-RAD-5X11-RT; Text2: *; Text1: *
footprint EL-RAD-5X11-RT (Capacitor, Electrolytic, THP, Radial, Dia 5.00mm, Pitch 2.0mm)
pins: 1, 2

## 100uF_16V_20%-NRSZ101M16V6.3X11F
designator C?, comment value 100uF  Voltage: 16V  (hidden comment: NRSZ101M16V6.3X11F)
Cap Electrolytic - Low Imp; Manufacturer: NIC; Tol: 20%; Part Number: NRSZ101M16V6.3X11F; Package: EL-RAD-6.3x11; EDM-PN: *; Text2: *; Text1: *
footprint EL-RAD-6.3X11 (Capacitor, Electrolytic, THP, Radial, Dia 6.3mm, Pitch 2.5mm)
pins: 1, 2

## 100uF_16V_20%-Rt
designator C?, comment value 100uF  Voltage: 16V  (hidden comment: CAP-EL_100uF_16V_20%)
Cap Electrolytic THP Radial; Manufacturer: Various; Tol: 20%; Part Number: CAP-EL_100uF_16V_20%; Package: EL-RAD-5X11-RT; EDM-PN: *; Text2: *; Text1: *
footprint EL-RAD-5X11-RT (Capacitor, Electrolytic, THP, Radial, Dia 5.00mm, Pitch 2.0mm)
pins: 1, 2
